# Altium footprint library Connectors.PcbLib: 76 footprints (part 1 of 5)
Each footprint in its own frame and in the unit in brackets; x right, y up, seen from the top. Pads: shape width x height; smd on the part's side, far side on the other; paste and mask are expansions set on the pad; w line width, h text height; cw(c..) or ccw(c..) is an arc to the next point about the centre after c.
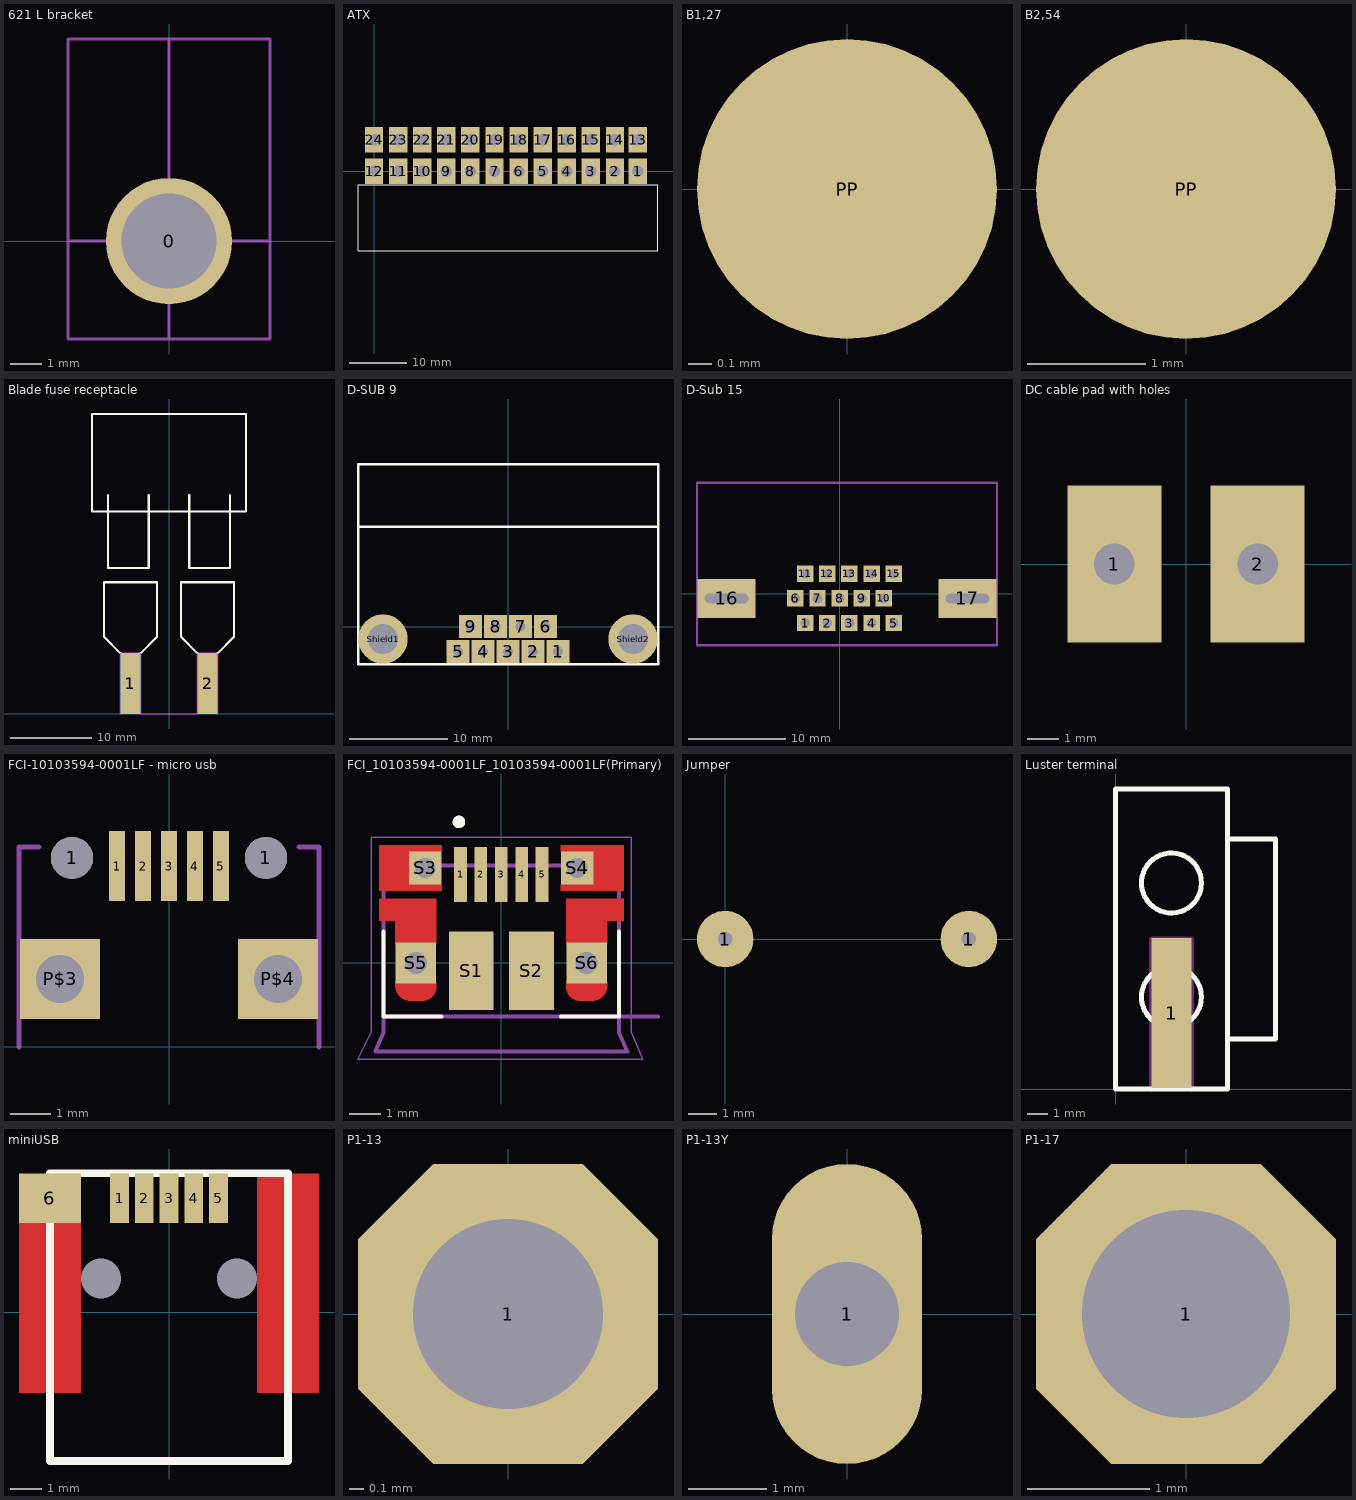
[diagram p0: the footprints below, top view; thin cyan lines are the x and y axes]

## 621 L bracket [mm] "Keystone Electronics  621  Mounting Brackets"
pads (1):
  round 4 hole 3: 0(0,0)
Mechanical 1:
  lines w0.1: -3.2,0 3.2,0 ; 0,-3.1 0,6.4 ; -3.2,-3.1 -3.2,6.4 3.2,6.4 3.2,-3.1 -3.2,-3.1

## ATX [mm] "Molex MINI-FIT JR. 24-polig"
height 9.6
pads (24):
  rect 3.2x4.4 hole 2 paste+0: 1(46,0) 2(42,0) 3(37.8,0) 4(33.6,0) 5(29.4,0) 6(25.2,0) 7(21,0) 8(16.8,0) 9(12.6,0) 10(8.4,0) 11(4.2,0) 12(0,0) 13(46,5.5) 14(42,5.5) 15(37.8,5.5) 16(33.6,5.5) 17(29.4,5.5) 18(25.2,5.5) 19(21,5.5) 20(16.8,5.5) 21(12.6,5.5) 22(8.4,5.5) 23(4.2,5.5) 24(0,5.5)
Top Overlay:
  lines w0.2: -2.794,-13.9 49.5,-13.9 49.5,-2.34 -2.794,-2.34 -2.794,-13.9
3D body "ATX.stp": height 12.4, standoff -2.6, extent -2.632,-13.97 49.368,5.965

## B1,27 [mm]
pads (1):
  rrect100% 1.27x1.27 smd paste-0.635: PP(0,0)
Mechanical 22:
  lines w0.002: -0.635,0 0.635,0 ; 0,-0.635 0,0.635

## B2,54 [mm]
pads (1):
  rrect100% 2.54x2.54 smd paste-1.27: PP(0,0)
Mechanical 22:
  circle w0.254: c0,0 r0.635
  lines w0.002: -0.635,0 0.635,0 ; 0,-0.635 0,0.635

## Blade fuse receptacle [mm]
pads (4):
  rect 2.5x7.5 smd mask+0: 1(-4.75,3.75) 2(4.75,3.75)
  rect 2.5x7.5 smd far side mask+0: 1(-4.75,3.75) 2(4.75,3.75)
Top Overlay:
  lines w0.254: -7.5,27 -7.5,18 -2.5,18 -2.5,27 ; -6,7.5 -8,9.5 -8,16.25 -1.5,16.25 -1.5,9.5 -3.5,7.5 ; 2.5,27 2.5,18 7.5,18 7.5,27 ; 3.5,7.5 1.5,9.5 1.5,16.25 8,16.25 8,9.5 6,7.5 ; -9.5,25 -9.5,37 9.5,37 9.5,25 -9.5,25
Keep-Out Layer:
  lines w0.254: -6,0 -6,7.5 -3.5,7.5 -3.5,0 3.5,0 3.5,7.5 6,7.5 6,0

## D-SUB 9 [mm]
pads (11):
  rect 2.3x2.3 hole 1: 1(5.08,-2.54) 2(2.54,-2.54) 3(0,-2.54) 4(-2.54,-2.54) 5(-5.08,-2.54) 6(3.81,0) 7(1.27,0) 8(-1.27,0) 9(-3.81,0)
  round 5 hole 3: Shield1(-12.7,-1.27) Shield2(12.7,-1.27)
Top Overlay:
  lines w0.254: -15.24,10.16 15.24,10.16 ; -15.24,-3.81 -15.24,16.51 15.24,16.51 15.24,-3.81 -15.24,-3.81

## D-Sub 15 [mm] "VGA connector"
pads (17):
  rect 1.7x1.7 hole 1: 1(-3.556,-3.048) 2(-1.27,-3.048) 3(1.016,-3.048) 4(3.302,-3.048) 5(5.588,-3.048) 6(-4.572,-0.508) 7(-2.286,-0.508) 8(0,-0.508) 9(2.286,-0.508) 10(4.572,-0.508) 11(-3.556,2.032) 12(-1.27,2.032) 13(1.016,2.032) 14(3.302,2.032) 15(5.588,2.032)
  rect 6x4 hole 1 slot 4.5 at 0 deg: 16(-11.684,-0.508) 17(13.208,-0.508)
Mechanical 1:
  lines w0.254: -14.732,-5.334 -14.732,11.43 16.256,11.43 16.256,-5.334 -14.732,-5.334
3D body "HDL_15-SL-B.STEP": height 12.77, standoff -3.69, extent -14.665,-5.324 16.135,16.876

## DC cable pad with holes [mm]
pads (2):
  rect 3x5 hole 1.3: 1(-2.286,0) 2(2.286,0)

## FCI-10103594-0001LF - micro usb [mm] "http://portal.fciconnect.com/res/en/pdffiles/doc_search/10103594.pdf"
pads (9):
  round 1.05 hole 1.05: 1(-2.425,4.73) 1(2.425,4.73)
  rect 0.4x1.75 smd: 1(-1.3,4.525) 2(-0.65,4.525) 3(0,4.525) 4(0.65,4.525) 5(1.3,4.525)
  rect 2x2 hole 1.2: P$3(-2.725,1.7) P$4(2.725,1.7)
Mechanical 2:
  lines w0.127: -3.75,0 -3.75,5 -3.25,5 ; 3.25,5 3.75,5 3.75,0

## FCI_10103594-0001LF_10103594-0001LF(Primary) [mm]
pads (11):
  rect 0.4x1.75 smd: 1(-1.3,2.825) 2(-0.65,2.825) 3(0,2.825) 4(0.65,2.825) 5(1.3,2.825)
  rect 1.425x2.5 smd: S1(-0.962,-0.25) S2(0.962,-0.25)
  rect 1.05x1.05 hole 0.65: S3(-2.425,3.03) S4(2.425,3.03)
  rect 1.3x1.3 hole 0.7: S5(-2.725,0) S6(2.725,0)
Top Layer:
  region: -1.9,3.555 -1.9,3.76 -3.9,3.76 -3.9,2.3 -1.9,2.3 -1.9,2.505 -2.9,2.505 -2.9,3.555
  region: 1.9,3.555 1.9,3.76 3.9,3.76 3.9,2.3 1.9,2.3 1.9,2.505 2.9,2.505 2.9,3.555
  region: -3.9,2.05 -3.9,1.35 -3.375,1.35 -3.375,0.6 -2.075,0.6 -2.075,2.05
  region: -3.375,-0.7 -3.375,-0.6 -2.075,-0.6 -2.075,-0.7 -2.073,-0.712 -2.071,-0.736 -2.07,-0.759 -2.071,-0.782 -2.072,-0.805 -2.075,-0.828 -2.079,-0.851 -2.084,-0.873 -2.091,-0.895 -2.098,-0.917 -2.107,-0.939 -2.117,-0.96 -2.128,-0.98 -2.14,-1 -2.153,-1.019 -2.167,-1.038 -2.181,-1.055 -2.197,-1.072 -2.214,-1.088 -2.231,-1.104 -2.25,-1.118 -2.268,-1.131 -2.288,-1.143 -2.308,-1.155 -2.329,-1.165 -2.35,-1.174 -2.372,-1.182 -2.394,-1.189 -2.417,-1.194 -2.44,-1.199 -2.45,-1.2 -2.95,-1.2 -2.965,-1.199 -2.989,-1.195 -3.013,-1.191 -3.037,-1.185 -3.06,-1.178 -3.083,-1.169 -3.105,-1.16 -3.127,-1.149 -3.148,-1.137 -3.169,-1.125 -3.189,-1.111 -3.208,-1.096 -3.226,-1.08 -3.244,-1.063 -3.26,-1.045 -3.276,-1.026 -3.29,-1.007 -3.304,-0.987 -3.317,-0.966 -3.328,-0.945 -3.338,-0.923 -3.347,-0.9 -3.355,-0.877 -3.362,-0.854 -3.367,-0.83 -3.372,-0.806 -3.375,-0.782 -3.376,-0.758 -3.377,-0.733 -3.376,-0.709
  region: 3.9,2.05 3.9,1.35 3.375,1.35 3.375,0.6 2.075,0.6 2.075,2.05
  region: 3.375,-0.7 3.375,-0.6 2.075,-0.6 2.075,-0.7 2.073,-0.712 2.071,-0.736 2.07,-0.759 2.071,-0.782 2.072,-0.805 2.075,-0.828 2.079,-0.851 2.084,-0.873 2.091,-0.895 2.098,-0.917 2.107,-0.939 2.117,-0.96 2.128,-0.98 2.14,-1 2.153,-1.019 2.167,-1.038 2.181,-1.055 2.197,-1.072 2.214,-1.088 2.231,-1.104 2.25,-1.118 2.268,-1.131 2.288,-1.143 2.308,-1.155 2.329,-1.165 2.35,-1.174 2.372,-1.182 2.394,-1.189 2.417,-1.194 2.44,-1.199 2.45,-1.2 2.95,-1.2 2.965,-1.199 2.989,-1.195 3.013,-1.191 3.037,-1.185 3.06,-1.178 3.083,-1.169 3.105,-1.16 3.127,-1.149 3.148,-1.137 3.169,-1.125 3.189,-1.111 3.208,-1.096 3.226,-1.08 3.244,-1.063 3.26,-1.045 3.276,-1.026 3.29,-1.007 3.304,-0.987 3.317,-0.966 3.328,-0.945 3.338,-0.923 3.347,-0.9 3.355,-0.877 3.362,-0.854 3.367,-0.83 3.372,-0.806 3.375,-0.782 3.376,-0.758 3.377,-0.733 3.376,-0.709
Top Overlay:
  circle w0.2: c-1.35,4.5 r0.1
  lines w0.127: -3.75,1 -3.75,-1.7 -1.9,-1.7 ; 1.9,-1.7 3.75,-1.7 3.75,1
Top Paste:
  drawing of 8 lines, arcs and shapes, not listed
Top Solder:
  region: -4,2.15 -1.95,2.15 -1.95,-0.7 -1.949,-0.716 -1.948,-0.745 -1.948,-0.774 -1.95,-0.803 -1.954,-0.832 -1.959,-0.86 -1.965,-0.888 -1.973,-0.916 -1.983,-0.943 -1.993,-0.97 -2.006,-0.997 -2.019,-1.022 -2.034,-1.047 -2.05,-1.071 -2.068,-1.094 -2.086,-1.116 -2.106,-1.137 -2.127,-1.157 -2.149,-1.176 -2.171,-1.194 -2.195,-1.211 -2.22,-1.226 -2.245,-1.24 -2.271,-1.253 -2.298,-1.264 -2.325,-1.274 -2.352,-1.282 -2.38,-1.289 -2.409,-1.295 -2.437,-1.299 -2.45,-1.3 -2.95,-1.3 -2.967,-1.299 -2.996,-1.295 -3.025,-1.29 -3.054,-1.283 -3.082,-1.275 -3.11,-1.266 -3.137,-1.255 -3.164,-1.242 -3.19,-1.228 -3.216,-1.213 -3.24,-1.197 -3.264,-1.179 -3.286,-1.16 -3.308,-1.14 -3.328,-1.118 -3.348,-1.096 -3.366,-1.073 -3.383,-1.049 -3.398,-1.024 -3.413,-0.998 -3.426,-0.971 -3.437,-0.944 -3.447,-0.916 -3.456,-0.888 -3.463,-0.86 -3.469,-0.831 -3.473,-0.801 -3.475,-0.772 -3.476,-0.742 -3.476,-0.713 -3.475,-0.7 -3.475,1.25 -4,1.25
  region: -4,3.86 -1.8,3.86 -1.8,2.2 -4,2.2
  region: 1.8,3.86 4,3.86 4,2.2 1.8,2.2
  region: 4,2.15 1.95,2.15 1.95,-0.7 1.949,-0.716 1.948,-0.745 1.948,-0.774 1.95,-0.803 1.954,-0.832 1.959,-0.86 1.965,-0.888 1.973,-0.916 1.983,-0.943 1.993,-0.97 2.006,-0.997 2.019,-1.022 2.034,-1.047 2.05,-1.071 2.068,-1.094 2.086,-1.116 2.106,-1.137 2.127,-1.157 2.149,-1.176 2.171,-1.194 2.195,-1.211 2.22,-1.226 2.245,-1.24 2.271,-1.253 2.298,-1.264 2.325,-1.274 2.352,-1.282 2.38,-1.289 2.409,-1.295 2.437,-1.299 2.45,-1.3 2.95,-1.3 2.967,-1.299 2.996,-1.295 3.025,-1.29 3.054,-1.283 3.082,-1.275 3.11,-1.266 3.137,-1.255 3.164,-1.242 3.19,-1.228 3.216,-1.213 3.24,-1.197 3.264,-1.179 3.286,-1.16 3.308,-1.14 3.328,-1.118 3.348,-1.096 3.366,-1.073 3.383,-1.049 3.398,-1.024 3.413,-0.998 3.426,-0.971 3.437,-0.944 3.447,-0.916 3.456,-0.888 3.463,-0.86 3.469,-0.831 3.473,-0.801 3.475,-0.772 3.476,-0.742 3.476,-0.713 3.475,-0.7 3.475,1.25 4,1.25
Mechanical 1:
  lines w0: -3.075,-0.25 ccw(c-2.725,-0.25) -2.375,-0.25 -2.375,0.25 ccw(c-2.725,0.25) -3.075,0.25 -3.075,-0.25 ; -2.75,2.83 ccw(c-2.425,2.83) -2.1,2.83 -2.1,3.23 ccw(c-2.425,3.23) -2.75,3.23 -2.75,2.83 ; 2.1,2.83 ccw(c2.425,2.83) 2.75,2.83 2.75,3.23 ccw(c2.425,3.23) 2.1,3.23 2.1,2.83 ; 2.375,-0.25 ccw(c2.725,-0.25) 3.075,-0.25 3.075,0.25 ccw(c2.725,0.25) 2.375,0.25 2.375,-0.25
Mechanical 4:
  circle w0.2: c-1.35,4.5 r0.1
  circle w0.2: c-1.35,4.5 r0.1
  lines w0.127: -4.02,-2.82 -3.75,-2.2 ; -4.02,-2.82 4.02,-2.82 ; -4.02,-2.82 -3.75,-2.2 ; -4.02,-2.82 4.02,-2.82 ; -3.75,-2.2 -3.75,-1.7 ; -3.75,-2.2 -3.75,-1.7 ; -3.75,-1.7 -3.75,3.11 ; -3.75,-1.7 5,-1.7 -3.75,-1.7 ; -3.75,-1.7 -3.75,3.11 ; -3.75,3.11 3.75,3.11 ; -3.75,3.11 3.75,3.11 ; 3.75,-2.2 3.75,3.11 ; 3.75,-2.2 4.02,-2.82 ; 3.75,-2.2 3.75,3.11 ; 3.75,-2.2 4.02,-2.82
Mechanical 16:
  lines w0.05: -4.57,-3.07 4.52,-3.07 4.15,-2.2 4.15,4.01 -4.15,4.01 -4.15,-2.2 -4.57,-3.07

## Jumper [mm]
pads (2):
  round 2 hole 0.5: 1(0,0) 1(8.636,0)

## Luster terminal [mm]
pads (1):
  rect 2x7.5 all layers, no hole: 1(2.8,3.8)
Top Overlay:
  circle w0.254: c2.8,4.6 r1.5
  circle w0.254: c2.8,10.3 r1.5
  lines w0.254: 5.6,2.5 8,2.5 8,12.5 5.6,12.5 ; 0,0 5.6,0 5.6,15 0,15 0,0
Keep-Out Layer:
  lines w0.254: 1.8,0 1.8,7.5 3.8,7.5 3.8,0

## miniUSB [mm]
pads (8):
  rect 0.6x1.6 smd: 1(-1.6,3.7) 2(-0.8,3.7) 3(0,3.7) 4(0.8,3.7) 5(1.6,3.7)
  rect 2x1.6 smd: 6(-3.85,3.7)
  rect 0x0 hole 1.3: 10(-2.2,1.1) 20(2.2,1.1)
Top Layer:
  rectangle: 2.85,-2.6 4.85,-1
  rectangle: 2.85,-1 4.85,4.5
  rectangle: -4.85,-2.6 -2.85,2.9
Top Overlay:
  lines w0.254: -3.85,-4.8 -3.85,4.5 3.85,4.5 3.85,-4.8 -3.85,-4.8
3D body "c-1734328-1-d-3d.stp": height 4.14, standoff -0.95, extent -4.95,-4.7 4.95,4.5

## P1-13 [mil]
pads (1):
  oct 82.3x82.3 hole 52: 1(0,0)
Mechanical 18:
  circle w6: c0,0 r30
  rectangle: -13,-13 13,13

## P1-13Y [mil]
pads (1):
  oval 75x150 hole 52: 1(0,0)
Mechanical 18:
  circle w6: c0,0 r30
  rectangle: -13,-13 13,13

## P1-17 [mil]
pads (1):
  oct 96.82x96.82 hole 67: 1(0,0)
Mechanical 18:
  circle w6: c0,0 r32
  rectangle: -13,-13 13,13